# Altium footprint library USRP2_Clone.PcbLib: 91 footprints (part 4 of 6)
Each footprint in its own frame and in the unit in brackets; x right, y up, seen from the top. Pads: shape width x height; smd on the part's side, far side on the other; paste and mask are expansions set on the pad; w line width, h text height; cw(c..) or ccw(c..) is an arc to the next point about the centre after c.
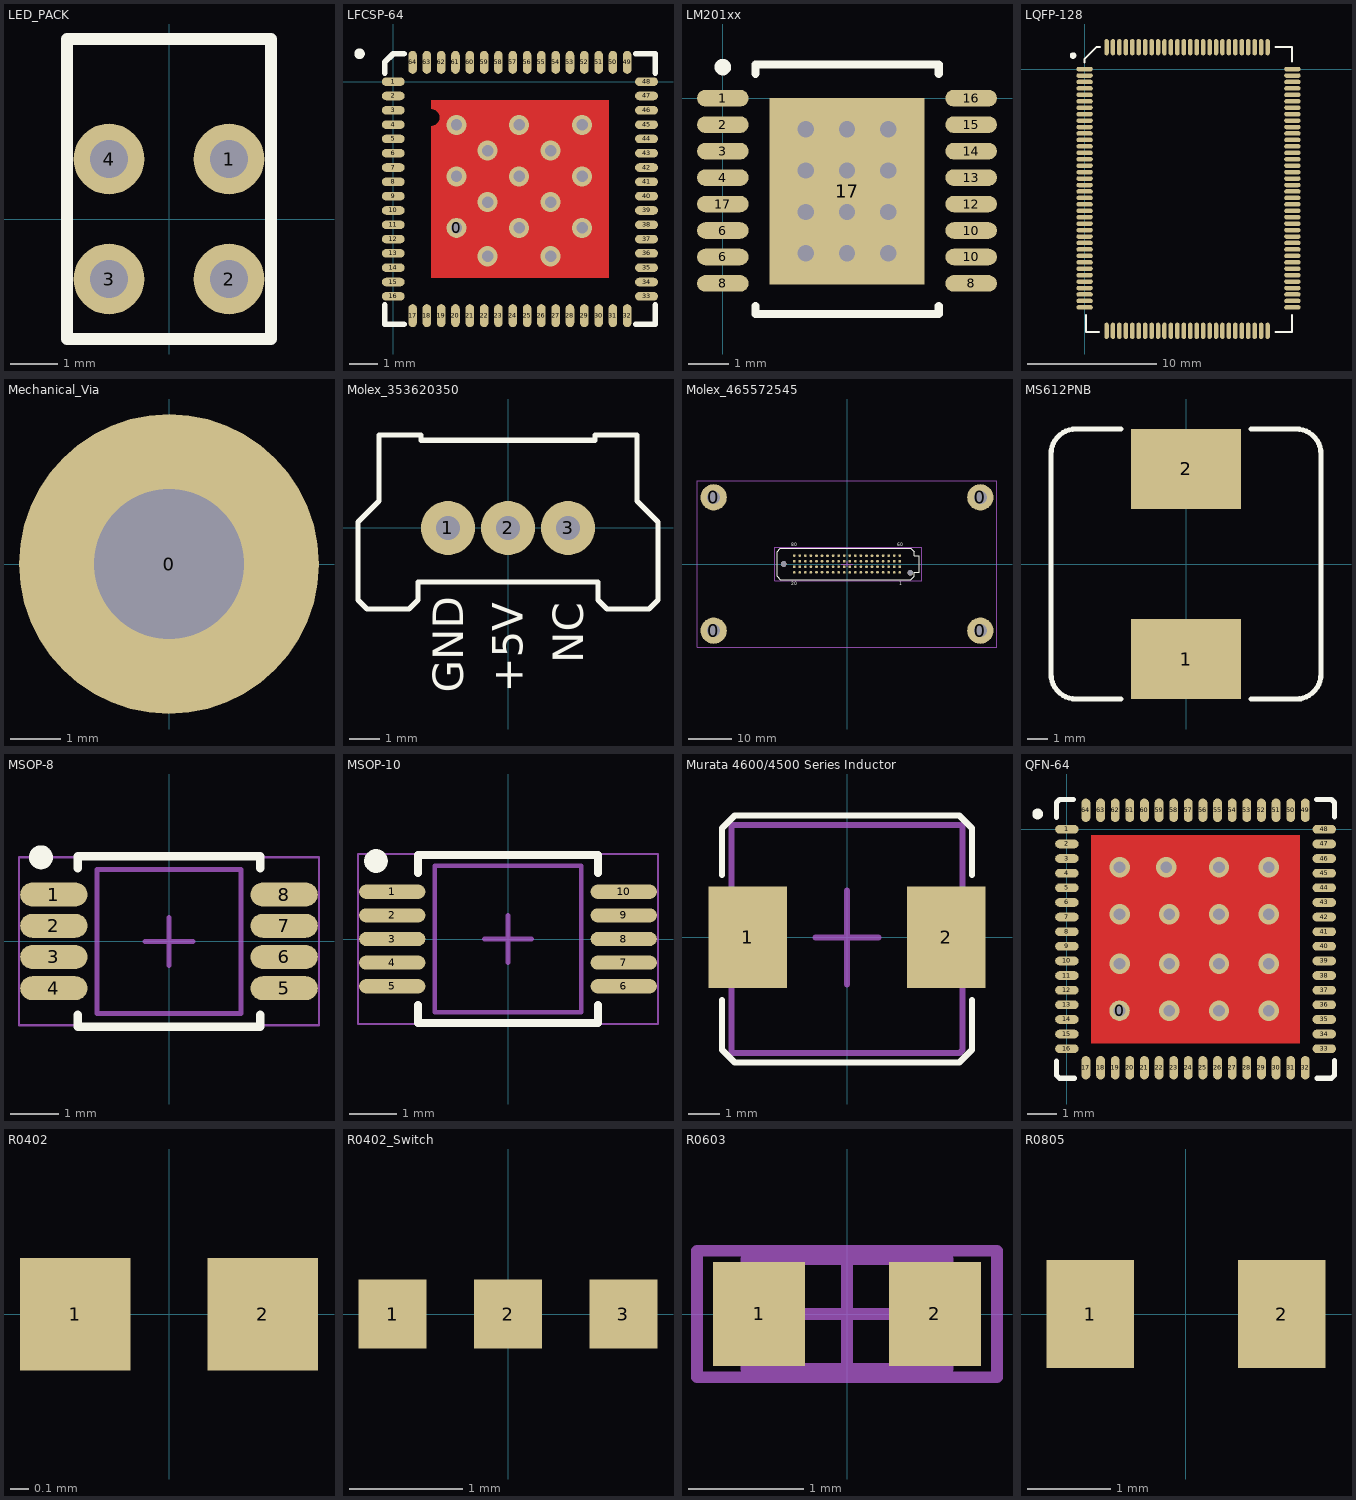
[diagram p3: the footprints below, top view; thin cyan lines are the x and y axes]

## LED_PACK [mm]
height 10
pads (4):
  round 1.5 hole 0.8: 1(1.27,1.27) 2(1.27,-1.27) 3(-1.27,-1.27) 4(-1.27,1.27)
Top Overlay:
  lines w0.254: -2.159,-2.54 -2.159,3.81 2.159,3.81 2.159,-2.54 -2.159,-2.54
3D body "User Library-Lumex SSF-LXH240GGD.step": height 2, standoff -10.82, extent -2.16,-2.413 2.16,8.357

## LFCSP-64 [mm]
height 1
pads (65):
  round 0.7 hole 0.4: 0(2.211,-5.111)
  oval 0.8x0.3 smd: 1(0,0) 2(0,-0.5) 3(0,-1) 4(0,-1.5) 5(0,-2) 6(0,-2.5) 7(0,-3) 8(0,-3.5) 9(0,-4) 10(0,-4.5) 11(0,-5) 12(0,-5.5) 13(0,-6) 14(0,-6.5) 15(0,-7) 16(0,-7.5) 33(8.85,-7.5) 34(8.85,-7) 35(8.85,-6.5) 36(8.85,-6) 37(8.85,-5.5) 38(8.85,-5) 39(8.85,-4.5) 40(8.85,-4) 41(8.85,-3.5) 42(8.85,-3) 43(8.85,-2.5) 44(8.85,-2) 45(8.85,-1.5) 46(8.85,-1) 47(8.85,-0.5) 48(8.85,0)
  oval 0.3x0.8 smd: 17(0.675,-8.175) 18(1.175,-8.175) 19(1.675,-8.175) 20(2.175,-8.175) 21(2.675,-8.175) 22(3.175,-8.175) 23(3.675,-8.175) 24(4.175,-8.175) 25(4.675,-8.175) 26(5.175,-8.175) 27(5.675,-8.175) 28(6.175,-8.175) 29(6.675,-8.175) 30(7.175,-8.175) 31(7.675,-8.175) 32(8.175,-8.175) 49(8.175,0.675) 50(7.675,0.675) 51(7.175,0.675) 52(6.675,0.675) 53(6.175,0.675) 54(5.675,0.675) 55(5.175,0.675) 56(4.675,0.675) 57(4.175,0.675) 58(3.675,0.675) 59(3.175,0.675) 60(2.675,0.675) 61(2.175,0.675) 62(1.675,0.675) 63(1.175,0.675) 64(0.675,0.675)
via 3.3,-6.1 diameter 0.7 hole 0.4
via 5.5,-6.1 diameter 0.7 hole 0.4
via 2.211,-1.511 diameter 0.7 hole 0.4
via 2.211,-3.311 diameter 0.7 hole 0.4
via 6.6,-5.111 diameter 0.7 hole 0.4
via 4.4,-5.111 diameter 0.7 hole 0.4
via 5.5,-4.211 diameter 0.7 hole 0.4
via 3.3,-4.211 diameter 0.7 hole 0.4
via 6.6,-3.311 diameter 0.7 hole 0.4
via 4.4,-3.311 diameter 0.7 hole 0.4
via 5.5,-2.411 diameter 0.7 hole 0.4
via 3.3,-2.411 diameter 0.7 hole 0.4
via 6.6,-1.511 diameter 0.7 hole 0.4
via 4.4,-1.511 diameter 0.7 hole 0.4
Top Layer:
  region: 1.325,-6.85 1.325,-1.55 1.384,-1.544 1.492,-1.499 1.574,-1.417 1.619,-1.309 1.619,-1.191 1.574,-1.083 1.492,-1.001 1.384,-0.956 1.325,-0.95 1.325,-0.65 7.525,-0.65 7.525,-6.85
Top Overlay:
  circle w0.254: c-1.175,0.975 r0.056
  lines w0.2: -0.3,-7.8 -0.3,-8.475 0.375,-8.475 ; -0.3,0.3 -0.3,0.675 0,0.975 0.375,0.975 ; 8.475,-8.475 9.15,-8.475 9.15,-7.8 ; 8.475,0.975 9.15,0.975 9.15,0.3
Top Paste:
  rectangle: 1.7,-6.5 4.3,-3.9
  rectangle: 1.7,-3.6 4.3,-1
  rectangle: 4.6,-3.6 7.1,-1
  rectangle: 4.6,-6.5 7.1,-3.9
3D body "User Library-LFCSP-64 AD9984AKCPZ-170.step": height 0.82, standoff -0.05, extent -0.075,-8.25 8.925,0.75

## LM201xx [mil]
height 118.11
pads (17):
  oval 50x16 smd: 1(0,0) 2(0,-25.59) 3(0,-51.18) 4(0,-76.77) 6(0,-153.54) 6(0,-127.95) 8(0,-179.13) 8(240,-179.13) 10(240,-153.54) 10(240,-127.95) 12(240,-102.36) 13(240,-76.77) 14(240,-51.18) 15(240,-25.59) 16(240,0) 17(0,-102.36)
  rect 150x180 all layers, no hole: 17(120,-90)
via 160,-150 diameter 27.56 hole 15.75
via 120,-150 diameter 27.56 hole 15.75
via 80,-150 diameter 27.56 hole 15.75
via 160,-110 diameter 27.56 hole 15.75
via 120,-110 diameter 27.56 hole 15.75
via 80,-110 diameter 27.56 hole 15.75
via 160,-70 diameter 27.56 hole 15.75
via 120,-70 diameter 27.56 hole 15.75
via 80,-70 diameter 27.56 hole 15.75
via 160,-30 diameter 27.56 hole 15.75
via 120,-30 diameter 27.56 hole 15.75
via 80,-30 diameter 27.56 hole 15.75
Top Overlay:
  circle w10: c0,30 r3
  lines w7.87: 31.5,-200.79 31.5,-208.66 208.66,-208.66 208.66,-200.79 ; 31.5,23.62 31.5,32.48 208.66,32.48 208.66,23.62
Top Paste:
  rectangle: 125,-115 190,-65
  rectangle: 50,-115 115,-65
  rectangle: 125,-175 190,-125
  rectangle: 50,-175 115,-125
  rectangle: 125,-55 190,-5
  rectangle: 50,-55 115,-5
3D body "User Library-tssop16-2.step": height 47.24, standoff 0, extent -5.9,-189.96 246.07,10.83

## LQFP-128 [mm]
height 2.7
pads (128):
  oval 1.27x0.35 smd: 1(0,0) 2(0,-0.5) 3(0,-1) 4(0,-1.5) 5(0,-2) 6(0,-2.5) 7(0,-3) 8(0,-3.5) 9(0,-4) 10(0,-4.5) 11(0,-5) 12(0,-5.5) 13(0,-6) 14(0,-6.5) 15(0,-7) 16(0,-7.5) 17(0,-8) 18(0,-8.5) 19(0,-9) 20(0,-9.5) 21(0,-10) 22(0,-10.5) 23(0,-11) 24(0,-11.5) 25(0,-12) 26(0,-12.5) 27(0,-13) 28(0,-13.5) 29(0,-14) 30(0,-14.5) 31(0,-15) 32(0,-15.5) 33(0,-16) 34(0,-16.5) 35(0,-17) 36(0,-17.5) 37(0,-18) 38(0,-18.5) 65(16.129,-18.5) 66(16.129,-18) 67(16.129,-17.5) 68(16.129,-17) 69(16.129,-16.5) 70(16.129,-16) 71(16.129,-15.5) 72(16.129,-15) 73(16.129,-14.5) 74(16.129,-14) 75(16.129,-13.5) 76(16.129,-13) 77(16.129,-12.5) 78(16.129,-12) 79(16.129,-11.5) 80(16.129,-11) 81(16.129,-10.5) 82(16.129,-10) 83(16.129,-9.5) 84(16.129,-9) 85(16.129,-8.5) 86(16.129,-8) 87(16.129,-7.5) 88(16.129,-7) 89(16.129,-6.5) 90(16.129,-6) 91(16.129,-5.5) 92(16.129,-5) 93(16.129,-4.5) 94(16.129,-4) 95(16.129,-3.5) 96(16.129,-3) 97(16.129,-2.5) 98(16.129,-2) 99(16.129,-1.5) 100(16.129,-1) 101(16.129,-0.5) 102(16.129,0)
  oval 0.35x1.27 smd: 39(1.7,-20.32) 40(2.2,-20.32) 41(2.7,-20.32) 42(3.2,-20.32) 43(3.7,-20.32) 44(4.2,-20.32) 45(4.7,-20.32) 46(5.2,-20.32) 47(5.7,-20.32) 48(6.2,-20.32) 49(6.7,-20.32) 50(7.2,-20.32) 51(7.7,-20.32) 52(8.2,-20.32) 53(8.7,-20.32) 54(9.2,-20.32) 55(9.7,-20.32) 56(10.2,-20.32) 57(10.7,-20.32) 58(11.2,-20.32) 59(11.7,-20.32) 60(12.2,-20.32) 61(12.7,-20.32) 62(13.2,-20.32) 63(13.7,-20.32) 64(14.2,-20.32) 103(14.2,1.7) 104(13.7,1.7) 105(13.2,1.7) 106(12.7,1.7) 107(12.2,1.7) 108(11.7,1.7) 109(11.2,1.7) 110(10.7,1.7) 111(10.2,1.7) 112(9.7,1.7) 113(9.2,1.7) 114(8.7,1.7) 115(8.2,1.7) 116(7.7,1.7) 117(7.2,1.7) 118(6.7,1.7) 119(6.2,1.7) 120(5.7,1.7) 121(5.2,1.7) 122(4.7,1.7) 123(4.2,1.7) 124(3.7,1.7) 125(3.2,1.7) 126(2.7,1.7) 127(2.2,1.7) 128(1.7,1.7)
Top Overlay:
  circle w0.254: c-0.9,1.05 r0.125
  lines w0.15: 0,0.5 0,0.8 0.9,1.7 1.2,1.7 ; 0.1,-19.1 0.1,-20.4 1.1,-20.4 ; 14.8,-20.4 16.1,-20.4 16.1,-19.1 ; 14.8,1.7 16.1,1.7 16.1,0.6
3D body "User Library-LQFP-128.step": height 1.51, standoff -0.04, extent -0.031,-20.482 16.181,1.733

## Mechanical_Via [mm] "Mechanical_Via"
pads (1):
  round 6 hole 3: 0(0,0)

## Molex_353620350 [mm]
height 8.5
pads (3):
  round 1.8 hole 0.8: 1(-2,0) 2(0,0) 3(2,0)
Top Overlay:
  lines w0.178: -5,-2.4 -5,-1.25 -5,0.2 -4.3,0.9 -4.3,3.1 -3,3.1 -2.9,3.1 -2.9,2.928 2.9,2.928 2.9,3.1 4.3,3.1 4.3,0.9 5,0.2 5,-1.025 5,-2.4 4.7,-2.7 3.3,-2.7 3,-2.4 3,-1.8 -3,-1.8 -3,-2.4 -3.3,-2.7 -4.7,-2.7 -5,-2.4
  text "GND" at -1.5,-5.5 h1.02
  text "+5V" at 0.5,-5.5 h1.02
  text "NC" at 2.5,-4.5 h1.02
3D body "353620350.stp": height 8.65, standoff -3.15, extent -4.85,-2.6 4.85,2.95

## Molex_465572545 [mm] "CONN FML 80POS 4ROWS GOLD"
height 8
pads (86):
  round 6 hole 3: 0(-30.48,-15.24) 0(-30.48,15.24) 0(30.48,-15.24) 0(30.48,15.24)
  round 1.27 hole 1.27 unplated: 0(-14.495,0) 0(14.495,-2.01)
  round 0.64 smd: 1(12.065,-1.905) 2(10.795,-1.905) 3(9.525,-1.905) 4(8.255,-1.905) 5(6.985,-1.905) 6(5.715,-1.905) 7(4.445,-1.905) 8(3.175,-1.905) 9(1.905,-1.905) 10(0.635,-1.905) 11(-0.635,-1.905) 12(-1.905,-1.905) 13(-3.175,-1.905) 14(-4.445,-1.905) 15(-5.715,-1.905) 16(-6.985,-1.905) 17(-8.255,-1.905) 18(-9.525,-1.905) 19(-10.795,-1.905) 20(-12.065,-1.905) 21(12.065,-0.635) 22(10.795,-0.635) 23(9.525,-0.635) 24(8.255,-0.635) 25(6.985,-0.635) 26(5.715,-0.635) 27(4.445,-0.635) 28(3.175,-0.635) 29(1.905,-0.635) 30(0.635,-0.635) 31(-0.635,-0.635) 32(-1.905,-0.635) 33(-3.175,-0.635) 34(-4.445,-0.635) 35(-5.715,-0.635) 36(-6.985,-0.635) 37(-8.255,-0.635) 38(-9.525,-0.635) 39(-10.795,-0.635) 40(-12.065,-0.635) 41(12.065,0.635) 42(10.795,0.635) 43(9.525,0.635) 44(8.255,0.635) 45(6.985,0.635) 46(5.715,0.635) 47(4.445,0.635) 48(3.175,0.635) 49(1.905,0.635) 50(0.635,0.635) 51(-0.635,0.635) 52(-1.905,0.635) 53(-3.175,0.635) 54(-4.445,0.635) 55(-5.715,0.635) 56(-6.985,0.635) 57(-8.255,0.635) 58(-9.525,0.635) 59(-10.795,0.635) 60(-12.065,0.635) 61(12.065,1.905) 62(10.795,1.905) 63(9.525,1.905) 64(8.255,1.905) 65(6.985,1.905) 66(5.715,1.905) 67(4.445,1.905) 68(3.175,1.905) 69(1.905,1.905) 70(0.635,1.905) 71(-0.635,1.905) 72(-1.905,1.905) 73(-3.175,1.905) 74(-4.445,1.905) 75(-5.715,1.905) 76(-6.985,1.905) 77(-8.255,1.905) 78(-9.525,1.905) 79(-10.795,1.905) 80(-12.065,1.905)
Top Overlay:
  lines w0.178: -16.002,-2.794 -15.24,-3.556 14.605,-3.556 15.367,-2.794 15.367,-1.905 16.51,-1.905 16.51,1.905 15.367,1.905 15.367,2.794 14.605,3.556 -15.24,3.556 -16.002,2.794 -16.002,-2.794
  text "80" at -12.7,4.064 h0.76
  text "60" at 11.43,4.064 h0.76
  text "20" at -12.7,-4.826 h0.76
  text "1" at 11.938,-4.826 h0.76
Mechanical 13:
  lines w0.254: -34.29,-19.05 -34.29,19.05 34.29,19.05 34.29,-19.05 -34.29,-19.05
Mechanical 15:
  lines w0.254: -1.27,0 1.27,0 0.635,0 ; 0,-0.635 0,0.635 ; -16.51,-3.81 17.145,-3.81 17.145,3.81 -16.51,3.81 -16.51,-3.81
3D body "465572545.stp": height 7.98, standoff -1.34, extent -16.027,-3.505 16.535,3.556

## MS612PNB [mm]
height 8
pads (2):
  rect 5.5x4 smd: 1(0,-4.75) 2(0,4.75)
Top Overlay:
  lines w0.254: -3.25,-6.75 -5.5,-6.75 cw(c-5.5,-5.5) -6.75,-5.5 -6.75,5.5 cw(c-5.5,5.5) -5.5,6.75 -3.25,6.75 ; 3.25,-6.75 5.75,-6.75 ; 3.25,6.75 5.5,6.75 cw(c5.5,5.5) 6.75,5.5 6.75,-5.5 cw(c5.5,-5.5) 5.5,-6.75
3D body "Coilcraft-MS612PNB.step": height 8.22, standoff -0.04, extent -6.15,-6.15 6.15,6.15

## MSOP-8 [mm] "MSOP, 8-Leads"
height 1.1
pads (8):
  oval 1.4x0.5 smd: 1(-2.4,0.975) 2(-2.4,0.325) 3(-2.4,-0.325) 4(-2.4,-0.975) 5(2.4,-0.975) 6(2.4,-0.325) 7(2.4,0.325) 8(2.4,0.975)
Top Overlay:
  circle w0.25: c-2.667,1.753 r0.125
  lines w0.178: -1.905,-1.524 -1.905,-1.778 1.905,-1.778 1.905,-1.524 ; -1.905,1.524 -1.905,1.778 1.905,1.778 1.905,1.524
Mechanical 13:
  lines w0.1: -1.5,-1.5 1.5,-1.5 1.5,1.5 -1.5,1.5 -1.5,-1.5
Mechanical 15:
  lines w0.05: -3.125,-1.75 3.125,-1.75 3.125,1.75 -3.125,1.75 -3.125,-1.75
  lines w0.1: -0.5,0 0.5,0 ; 0,-0.5 0,0.5
3D body "User Library-MSOP8-2.step": height 1.01, standoff 0, extent -2.575,-1.6 2.575,1.6

## MSOP-10 [mm] "MSOP, 10-Leads"
height 1.1
pads (10):
  oval 1.4x0.3 smd: 1(-2.45,1) 2(-2.45,0.5) 3(-2.45,0) 4(-2.45,-0.5) 5(-2.45,-1) 6(2.45,-1) 7(2.45,-0.5) 8(2.45,0) 9(2.45,0.5) 10(2.45,1)
Top Overlay:
  circle w0.25: c-2.794,1.651 r0.125
  lines w0.178: -1.905,-1.397 -1.905,-1.778 1.905,-1.778 1.905,-1.397 ; -1.905,1.397 -1.905,1.778 1.905,1.778 1.905,1.397
Mechanical 13:
  lines w0.1: -1.55,-1.55 -1.55,1.55 1.55,1.55 1.55,-1.55 -1.55,-1.55
Mechanical 15:
  lines w0.05: -3.175,-1.8 -3.175,1.8 3.175,1.8 3.175,-1.8 -3.175,-1.8
  lines w0.1: -0.5,0 0.5,0 ; 0,-0.5 0,0.5
3D body "User Library-MSOP10-1.step": height 1.09, standoff 0, extent -2.575,-1.6 2.575,1.6

## Murata 4600/4500 Series Inductor [mm]
height 4
pads (2):
  rect 2.5x3.25 smd: 1(-3.175,0) 2(3.175,0)
Top Overlay:
  lines w0.2: -4,-2 -4,-3.6 -3.6,-4 3.6,-4 4,-3.6 4,-2 ; -4,2 -4,3.5 -3.6,3.9 3.6,3.9 4,3.5 4,2
Mechanical 15:
  lines w0.2: -1,0 1,0 ; 0,-1.5 0,1.5 ; 3.6,3.6 -3.7,3.6 -3.7,-3.7 3.6,-3.7 3.7,-3.6 3.7,3.6
3D body "User Library-Murata_4600.step": height 4.55, standoff 0, extent -3.714,-3.7 3.714,3.6

## QFN-64 [mm]
height 0.75
pads (65):
  round 0.7 hole 0.4: 0(1.8,-6.2)
  oval 0.8x0.3 smd: 1(0,0) 2(0,-0.5) 3(0,-1) 4(0,-1.5) 5(0,-2) 6(0,-2.5) 7(0,-3) 8(0,-3.5) 9(0,-4) 10(0,-4.5) 11(0,-5) 12(0,-5.5) 13(0,-6) 14(0,-6.5) 15(0,-7) 16(0,-7.5) 33(8.8,-7.5) 34(8.8,-7) 35(8.8,-6.5) 36(8.8,-6) 37(8.8,-5.5) 38(8.8,-5) 39(8.8,-4.5) 40(8.8,-4) 41(8.8,-3.5) 42(8.8,-3) 43(8.8,-2.5) 44(8.8,-2) 45(8.8,-1.5) 46(8.8,-1) 47(8.8,-0.5) 48(8.8,0)
  oval 0.3x0.8 smd: 17(0.65,-8.15) 18(1.15,-8.15) 19(1.65,-8.15) 20(2.15,-8.15) 21(2.65,-8.15) 22(3.15,-8.15) 23(3.65,-8.15) 24(4.15,-8.15) 25(4.65,-8.15) 26(5.15,-8.15) 27(5.65,-8.15) 28(6.15,-8.15) 29(6.65,-8.15) 30(7.15,-8.15) 31(7.65,-8.15) 32(8.15,-8.15) 49(8.15,0.65) 50(7.65,0.65) 51(7.15,0.65) 52(6.65,0.65) 53(6.15,0.65) 54(5.65,0.65) 55(5.15,0.65) 56(4.65,0.65) 57(4.15,0.65) 58(3.65,0.65) 59(3.15,0.65) 60(2.65,0.65) 61(2.15,0.65) 62(1.65,0.65) 63(1.15,0.65) 64(0.65,0.65)
via 5.2,-2.9 diameter 0.7 hole 0.4
via 3.5,-2.9 diameter 0.7 hole 0.4
via 3.4,-1.3 diameter 0.7 hole 0.4
via 1.8,-1.3 diameter 0.7 hole 0.4
via 1.8,-2.9 diameter 0.7 hole 0.4
via 5.2,-1.3 diameter 0.7 hole 0.4
via 6.9,-1.3 diameter 0.7 hole 0.4
via 6.9,-2.9 diameter 0.7 hole 0.4
via 3.5,-4.6 diameter 0.7 hole 0.4
via 1.8,-4.6 diameter 0.7 hole 0.4
via 3.5,-6.2 diameter 0.7 hole 0.4
via 5.2,-4.6 diameter 0.7 hole 0.4
via 6.9,-4.6 diameter 0.7 hole 0.4
via 5.2,-6.2 diameter 0.7 hole 0.4
via 6.9,-6.2 diameter 0.7 hole 0.4
Top Layer:
  rectangle: 0.825,-7.325 7.975,-0.2
Top Overlay:
  circle w0.254: c-1,0.525 r0.056
  lines w0.178: -0.356,-7.925 -0.356,-8.407 -0.254,-8.509 0.254,-8.509 ; -0.356,0.406 -0.356,0.914 -0.254,1.016 0.229,1.016 ; 8.534,1.016 9.042,1.016 9.144,0.914 9.144,0.432 ; 8.56,-8.509 9.042,-8.509 9.144,-8.407 9.144,-7.899
Top Paste:
  rectangle: 4.6,-7 7.6,-4
  rectangle: 1.1,-7 4.1,-4
  rectangle: 4.6,-3.5 7.6,-0.5
  rectangle: 1.1,-3.5 4.1,-0.5
3D body "User Library-WQFN-64.step": height 0.8, standoff 0, extent -0.11,-8.26 8.91,0.76

## R0402 [mil]
height 12.6
pads (2):
  rect 23.62x24 smd: 1(-20,0) 2(20,0)
3D body "User Library-0402R.step": height 13.39, standoff 0, extent -20.47,-11.8 20.48,11.82

## R0402_Switch [mil]
height 12.6
pads (3):
  rect 23.62x24 smd: 1(-40,0) 2(0,0) 3(40,0)
3D body "User Library-0402R.step": height 13.39, standoff 0, extent -40.47,-11.8 0.48,11.82

## R0603 [mm] "Chip Capacitor, Body 1.6x0.8mm, IPC High Density"
height 1.3
pads (2):
  rect 0.8x0.9 smd: 1(-0.762,0) 2(0.762,0)
Mechanical 13:
  lines w0.1: -0.875,-0.475 0.875,-0.475 0.875,0.475 -0.875,0.475 -0.875,-0.475
Mechanical 15:
  lines w0.1: -0.475,0 0.475,0 ; 0,-0.475 0,0.475 ; -1.3,-0.55 1.3,-0.55 1.3,0.55 -1.3,0.55 -1.3,-0.55
3D body "User Library-RES-0603.step": height 0.56, standoff 0, extent -0.85,-0.4 0.85,0.4

## R0805 [mm]
height 0.5
pads (2):
  rect 1.05x1.3 smd: 1(-1.15,0) 2(1.15,0)
3D body "User Library-RES-0805.step": height 0.76, standoff 0, extent -1.15,-0.675 1.15,0.675